# Altium footprint library ubloxLib.PcbLib: 20 footprints (part 2 of 2)
Each footprint in its own frame and in the unit in brackets; x right, y up, seen from the top. Pads: shape width x height; smd on the part's side, far side on the other; paste and mask are expansions set on the pad; w line width, h text height; cw(c..) or ccw(c..) is an arc to the next point about the centre after c.
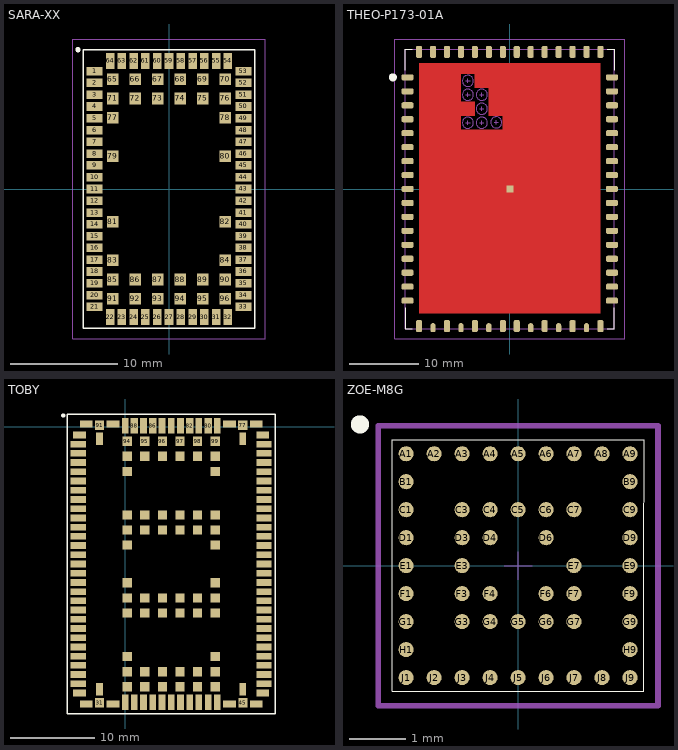
[diagram p1: the footprints below, top view; thin cyan lines are the x and y axes]

## SARA-XX [mm] "GSM/GPRS and GSM/EGPRS/HSPA Cellular Module"
height 3.25
pads (96):
  rect 1.5x0.8 smd paste-1: 1(-6.95,11) 2(-6.95,9.9) 3(-6.95,8.8) 4(-6.95,7.7) 5(-6.95,6.6) 6(-6.95,5.5) 7(-6.95,4.4) 8(-6.95,3.3) 9(-6.95,2.2) 10(-6.95,1.1) 11(-6.95,0) 12(-6.95,-1.1) 13(-6.95,-2.2) 14(-6.95,-3.3) 15(-6.95,-4.4) 16(-6.95,-5.5) 17(-6.95,-6.6) 18(-6.95,-7.7) 19(-6.95,-8.8) 20(-6.95,-9.9) 21(-6.95,-11) 33(6.95,-11) 34(6.95,-9.9) 35(6.95,-8.8) 36(6.95,-7.7) 37(6.95,-6.6) 38(6.95,-5.5) 39(6.95,-4.4) 40(6.95,-3.3) 41(6.95,-2.2) 42(6.95,-1.1) 43(6.95,0) 44(6.95,1.1) 45(6.95,2.2) 46(6.95,3.3) 47(6.95,4.4) 48(6.95,5.5) 49(6.95,6.6) 50(6.95,7.7) 51(6.95,8.8) 52(6.95,9.9) 53(6.95,11)
  rect 0.8x1.5 smd paste-1: 22(-5.5,-11.95) 23(-4.4,-11.95) 24(-3.3,-11.95) 25(-2.2,-11.95) 26(-1.1,-11.95) 27(0,-11.95) 28(1.1,-11.95) 29(2.2,-11.95) 30(3.3,-11.95) 31(4.4,-11.95) 32(5.5,-11.95) 54(5.5,11.95) 55(4.4,11.95) 56(3.3,11.95) 57(2.2,11.95) 58(1.1,11.95) 59(0,11.95) 60(-1.1,11.95) 61(-2.2,11.95) 62(-3.3,11.95) 63(-4.4,11.95) 64(-5.5,11.95)
  rect 1.1x1.1 smd paste-0.025: 65(-5.25,10.25) 66(-3.15,10.25) 67(-1.05,10.25) 68(1.05,10.25) 69(3.15,10.25) 70(5.25,10.25) 71(-5.25,8.45) 72(-3.15,8.45) 73(-1.05,8.45) 74(1.05,8.45) 75(3.15,8.45) 76(5.25,8.45) 77(-5.25,6.65) 78(5.25,6.65) 79(-5.25,3.05) 80(5.25,3.05) 81(-5.25,-3.05) 82(5.25,-3.05) 83(-5.25,-6.65) 84(5.25,-6.65) 85(-5.25,-8.45) 86(-3.15,-8.45) 87(-1.05,-8.45) 88(1.05,-8.45) 89(3.15,-8.45) 90(5.25,-8.45) 91(-5.25,-10.25) 92(-3.15,-10.25) 93(-1.05,-10.25) 94(1.05,-10.25) 95(3.15,-10.25) 96(5.25,-10.25)
Top Overlay:
  circle w0.4: c-8.5,13 r0.05
  lines w0.15: -8,-13 -8,13 8,13 8,-13 -8,-13
Top Paste:
  region: -5.125,11.225 -5.125,12.775 -5.875,12.775 -5.875,11.225
  region: -4.025,11.225 -4.025,12.775 -4.775,12.775 -4.775,11.225
  region: -2.925,11.225 -2.925,12.775 -3.675,12.775 -3.675,11.225
  region: -1.825,11.225 -1.825,12.775 -2.575,12.775 -2.575,11.225
  region: -0.725,11.225 -0.725,12.775 -1.475,12.775 -1.475,11.225
  region: 0.375,11.225 0.375,12.775 -0.375,12.775 -0.375,11.225
  region: 1.475,11.225 1.475,12.775 0.725,12.775 0.725,11.225
  region: 5.875,11.225 5.875,12.775 5.125,12.775 5.125,11.225
  region: 2.575,11.225 2.575,12.775 1.825,12.775 1.825,11.225
  region: 3.675,11.225 3.675,12.775 2.925,12.775 2.925,11.225
  region: 4.775,11.225 4.775,12.775 4.025,12.775 4.025,11.225
  rectangle: 6.225,10.625 7.775,11.375
  rectangle: 6.225,9.525 7.775,10.275
  rectangle: 6.225,8.425 7.775,9.175
  rectangle: 6.225,7.325 7.775,8.075
  rectangle: 6.225,6.225 7.775,6.975
  rectangle: 6.225,5.125 7.775,5.875
  rectangle: 6.225,4.025 7.775,4.775
  rectangle: 6.225,2.925 7.775,3.675
  rectangle: 6.225,1.825 7.775,2.575
  rectangle: 6.225,0.725 7.775,1.475
  rectangle: 6.225,-0.375 7.775,0.375
  rectangle: 6.225,-1.475 7.775,-0.725
  rectangle: 6.225,-2.575 7.775,-1.825
  rectangle: 6.225,-3.675 7.775,-2.925
  rectangle: 6.225,-4.775 7.775,-4.025
  rectangle: 6.225,-5.875 7.775,-5.125
  rectangle: 6.225,-6.975 7.775,-6.225
  rectangle: 6.225,-8.075 7.775,-7.325
  rectangle: 6.225,-9.175 7.775,-8.425
  rectangle: 6.225,-10.275 7.775,-9.525
  rectangle: 6.225,-11.375 7.775,-10.625
  region: 5.875,-12.775 5.875,-11.225 5.125,-11.225 5.125,-12.775
  region: 4.775,-12.775 4.775,-11.225 4.025,-11.225 4.025,-12.775
  region: 3.675,-12.775 3.675,-11.225 2.925,-11.225 2.925,-12.775
  region: 2.575,-12.775 2.575,-11.225 1.825,-11.225 1.825,-12.775
  region: 1.475,-12.775 1.475,-11.225 0.725,-11.225 0.725,-12.775
  region: 0.375,-12.775 0.375,-11.225 -0.375,-11.225 -0.375,-12.775
  region: -0.725,-12.775 -0.725,-11.225 -1.475,-11.225 -1.475,-12.775
  region: -1.825,-12.775 -1.825,-11.225 -2.575,-11.225 -2.575,-12.775
  region: -2.925,-12.775 -2.925,-11.225 -3.675,-11.225 -3.675,-12.775
  region: -4.025,-12.775 -4.025,-11.225 -4.775,-11.225 -4.775,-12.775
  region: -5.125,-12.775 -5.125,-11.225 -5.875,-11.225 -5.875,-12.775
  rectangle: -7.775,-11.375 -6.225,-10.625
  rectangle: -7.775,-10.275 -6.225,-9.525
  rectangle: -7.775,-9.175 -6.225,-8.425
  rectangle: -7.775,-8.075 -6.225,-7.325
  rectangle: -7.775,-6.975 -6.225,-6.225
  rectangle: -7.775,-5.875 -6.225,-5.125
  rectangle: -7.775,-4.775 -6.225,-4.025
  rectangle: -7.775,-3.675 -6.225,-2.925
  rectangle: -7.775,-2.575 -6.225,-1.825
  rectangle: -7.775,-1.475 -6.225,-0.725
  rectangle: -7.775,-0.375 -6.225,0.375
  rectangle: -7.775,0.725 -6.225,1.475
  rectangle: -7.775,1.825 -6.225,2.575
  rectangle: -7.775,2.925 -6.225,3.675
  rectangle: -7.775,4.025 -6.225,4.775
  rectangle: -7.775,5.125 -6.225,5.875
  rectangle: -7.775,6.225 -6.225,6.975
  rectangle: -7.775,7.325 -6.225,8.075
  rectangle: -7.775,8.425 -6.225,9.175
  rectangle: -7.775,9.525 -6.225,10.275
  rectangle: -7.775,10.625 -6.225,11.375
Mechanical 15:
  lines w0.05: -9,-14 -9,14 9,14 9,-14 -9,-14
3D body: height 3.25, standoff 0, extent -8,-13 8,13
3D body "SARA.STEP": height 0.13, standoff -2.87, extent -8,-13.05 8,12.95

## THEO-P173-01A [mm] "Host-based V2X transceiver module"
height 3.5
pads (69):
  rrect50% 1.7x0.87 smd: 1(-14.65,16) 2(-14.65,14) 3(-14.65,12) 4(-14.65,10) 5(-14.65,8) 6(-14.65,6) 7(-14.65,4) 8(-14.65,2) 9(-14.65,0) 10(-14.65,-2) 11(-14.65,-4) 12(-14.65,-6) 13(-14.65,-8) 14(-14.65,-10) 15(-14.65,-12) 16(-14.65,-14) 17(-14.65,-16) 32(14.65,-16) 33(14.65,-14) 34(14.65,-12) 35(14.65,-10) 36(14.65,-8) 37(14.65,-6) 38(14.65,-4) 39(14.65,-2) 40(14.65,0) 41(14.65,2) 42(14.65,4) 43(14.65,6) 44(14.65,8) 45(14.65,10) 46(14.65,12) 47(14.65,14) 48(14.65,16)
  rrect50% 0.87x1.7 smd: 18(-13,-19.65) 20(-9,-19.65) 22(-5,-19.65) 24(-1,-19.65) 25(1,-19.65) 27(5,-19.65) 29(9,-19.65) 31(13,-19.65) 49(13,19.65) 50(11,19.65) 51(9,19.65) 52(7,19.65) 53(5,19.65) 54(3,19.65) 55(1,19.65) 56(-1,19.65) 57(-3,19.65) 58(-5,19.65) 59(-7,19.65) 60(-9,19.65) 61(-11,19.65) 62(-13,19.65)
  rrect50% 0.76x1.1 smd: 19(-11,-19.95) 21(-7,-19.95) 23(-3,-19.95) 26(3,-19.95) 28(7,-19.95) 30(11,-19.95)
  round 0.76 smd: 19(-11,-19.6) 21(-7,-19.6) 23(-3,-19.6) 26(3,-19.6) 28(7,-19.6) 30(11,-19.6)
  rect 1x1 smd paste-1: GND_TAB(0,0)
Top Layer:
  region: -13,18 13,18 13,-17.8 -1,-17.8 -1,10.5 -3,10.5 -3,14.5 -5,14.5 -5,16.5 -7,16.5 -7,12.5 -5,12.5 -5,10.5 -7,10.5 -7,8.5 -1,8.5 -1,-17.8 -13,-17.8
Top Overlay:
  circle w0.635: c-16.754,16 r0.254
  lines w0.15: -15,-17 -15,-20 -14,-20 ; -15,17 -15,20 -14,20 ; 14,-20 15,-20 15,-17 ; 14,20 15,20 15,17
Top Paste:
  rectangle: -6.5,-2.3 -4.5,-0.3
  rectangle: -3.5,-2.3 -1.5,-0.3
  rectangle: -3.5,-5.3 -1.5,-3.3
  rectangle: -6.5,-5.3 -4.5,-3.3
  rectangle: -3.5,-8.3 -1.5,-6.3
  rectangle: -6.5,-8.3 -4.5,-6.3
  rectangle: -6.5,-17.3 -4.5,-15.3
  rectangle: -3.5,-17.3 -1.5,-15.3
  rectangle: -6.5,-14.3 -4.5,-12.3
  rectangle: -3.5,-14.3 -1.5,-12.3
  rectangle: -3.5,-11.3 -1.5,-9.3
  rectangle: -6.5,-11.3 -4.5,-9.3
  rectangle: -6.5,6.5 -4.5,8
  rectangle: -3.5,6.5 -1.5,8
  rectangle: -3.5,3.5 -1.5,5.5
  rectangle: -6.5,3.5 -4.5,5.5
  rectangle: -3.5,0.5 -1.5,2.5
  rectangle: -6.5,0.5 -4.5,2.5
  rectangle: -6.5,11 -5.5,11.5
  rectangle: -2.5,12.5 -1.5,14.5
  rectangle: -3.5,15.5 -1.5,17.5
  rectangle: -6.5,17 -4.5,17.5
  rectangle: -12.5,15.5 -10.5,17.5
  rectangle: -9.5,15.5 -7.5,17.5
  rectangle: -9.5,12.5 -7.5,14.5
  rectangle: -12.5,12.5 -10.5,14.5
  rectangle: -9.5,9.5 -7.5,11.5
  rectangle: -12.5,9.5 -10.5,11.5
  rectangle: -12.5,0.5 -10.5,2.5
  rectangle: -9.5,0.5 -7.5,2.5
  rectangle: -12.5,3.5 -10.5,5.5
  rectangle: -9.5,3.5 -7.5,5.5
  rectangle: -9.5,6.5 -7.5,8.5
  rectangle: -12.5,6.5 -10.5,8.5
  rectangle: -12.5,-11.3 -10.5,-9.3
  rectangle: -9.5,-11.3 -7.5,-9.3
  rectangle: -9.5,-14.3 -7.5,-12.3
  rectangle: -12.5,-14.3 -10.5,-12.3
  rectangle: -9.5,-17.3 -7.5,-15.3
  rectangle: -12.5,-17.3 -10.5,-15.3
  rectangle: -12.5,-8.3 -10.5,-6.3
  rectangle: -9.5,-8.3 -7.5,-6.3
  rectangle: -12.5,-5.3 -10.5,-3.3
  rectangle: -9.5,-5.3 -7.5,-3.3
  rectangle: -9.5,-2.3 -7.5,-0.3
  rectangle: -12.5,-2.3 -10.5,-0.3
  rectangle: -2.5,11 -1.5,11.5
  rectangle: 7.5,15.5 9.5,17.5
  rectangle: 10.5,15.5 12.5,17.5
  rectangle: 10.5,12.5 12.5,14.5
  rectangle: 7.5,12.5 9.5,14.5
  rectangle: 10.5,9.5 12.5,11.5
  rectangle: 7.5,9.5 9.5,11.5
  rectangle: 7.5,0.5 9.5,2.5
  rectangle: 10.5,0.5 12.5,2.5
  rectangle: 7.5,3.5 9.5,5.5
  rectangle: 10.5,3.5 12.5,5.5
  rectangle: 10.5,6.5 12.5,8.5
  rectangle: 7.5,6.5 9.5,8.5
  rectangle: 7.5,-11.3 9.5,-9.3
  rectangle: 10.5,-11.3 12.5,-9.3
  rectangle: 10.5,-14.3 12.5,-12.3
  rectangle: 7.5,-14.3 9.5,-12.3
  rectangle: 10.5,-17.3 12.5,-15.3
  rectangle: 7.5,-17.3 9.5,-15.3
  rectangle: 7.5,-8.3 9.5,-6.3
  rectangle: 10.5,-8.3 12.5,-6.3
  rectangle: 7.5,-5.3 9.5,-3.3
  rectangle: 10.5,-5.3 12.5,-3.3
  rectangle: 10.5,-2.3 12.5,-0.3
  rectangle: 7.5,-2.3 9.5,-0.3
  rectangle: 1.5,15.5 3.5,17.5
  rectangle: 4.5,15.5 6.5,17.5
  rectangle: 4.5,12.5 6.5,14.5
  rectangle: 1.5,12.5 3.5,14.5
  rectangle: 4.5,9.5 6.5,11.5
  rectangle: 1.5,9.5 3.5,11.5
  rectangle: 1.5,0.5 3.5,2.5
  rectangle: 4.5,0.5 6.5,2.5
  rectangle: 1.5,3.5 3.5,5.5
  rectangle: 4.5,3.5 6.5,5.5
  rectangle: 4.5,6.5 6.5,8.5
  rectangle: 1.5,6.5 3.5,8.5
  rectangle: 1.5,-11.3 3.5,-9.3
  rectangle: 4.5,-11.3 6.5,-9.3
  rectangle: 4.5,-14.3 6.5,-12.3
  rectangle: 1.5,-14.3 3.5,-12.3
  rectangle: 4.5,-17.3 6.5,-15.3
  rectangle: 1.5,-17.3 3.5,-15.3
  rectangle: 1.5,-8.3 3.5,-6.3
  rectangle: 4.5,-8.3 6.5,-6.3
  rectangle: 1.5,-5.3 3.5,-3.3
  rectangle: 4.5,-5.3 6.5,-3.3
  rectangle: 4.5,-2.3 6.5,-0.3
  rectangle: 1.5,-2.3 3.5,-0.3
  rectangle: -0.5,15.5 0.5,17.5
  rectangle: -0.5,12.5 0.5,14.5
  rectangle: -0.5,6.5 0.5,8.5
  rectangle: -0.5,9.5 0.5,11.5
  rectangle: -0.5,-2.3 0.5,-0.3
  rectangle: -0.5,-5.3 0.5,-3.3
  rectangle: -0.5,0.5 0.5,2.5
  rectangle: -0.5,3.5 0.5,5.5
  rectangle: -0.5,-14.3 0.5,-12.3
  rectangle: -0.5,-17.3 0.5,-15.3
  rectangle: -0.5,-11.3 0.5,-9.3
  rectangle: -0.5,-8.3 0.5,-6.3
Top Solder:
  region: -13.1,18.1 13.1,18.1 13.1,-17.9 -0.8,-17.9 -0.8,10.7 -2.8,10.7 -2.8,14.7 -4.8,14.7 -4.8,16.7 -7.2,16.7 -7.2,12.3 -5.2,12.3 -5.2,10.7 -7.2,10.7 -7.2,8.3 -0.8,8.3 -0.8,-17.9 -13.1,-17.9
Mechanical 13:
  circle w0.025: c-4,13.5 r0.8
  circle w0.025: c-4,9.5 r0.8
  circle w0.025: c-1.95,9.55 r0.8
  circle w0.025: c-6,9.5 r0.8
  circle w0.025: c-4,11.5 r0.8
  circle w0.025: c-6,13.5 r0.8
  circle w0.025: c-6,15.5 r0.8
  circle w0.025: c0,0 r0.762
  lines w0.025: -6.3,9.5 -5.7,9.5 ; -6.3,13.5 -5.7,13.5 ; -6.3,15.5 -5.7,15.5 ; -6,9.2 -6,9.8 ; -6,13.2 -6,13.8 ; -6,15.2 -6,15.8 ; -4.3,9.5 -3.7,9.5 ; -4.3,11.5 -3.7,11.5 ; -4.3,13.5 -3.7,13.5 ; -4,9.2 -4,9.8 ; -4,11.2 -4,11.8 ; -4,13.2 -4,13.8 ; -2.25,9.55 -1.65,9.55 ; -1.95,9.25 -1.95,9.85 ; -0.762,0 0.762,0 ; 0,-0.762 0,0.762
  lines w0.1: -15,-20 -15,20 15,20 15,-20 -15,-20
Mechanical 15:
  lines w0.05: -16.5,-21.5 -16.5,21.5 16.5,21.5 16.5,-21.5 -16.5,-21.5
3D body: height 3.6, standoff 0, extent -15,-20 15,20

## TOBY [mm] "TOBY cellular module"
pads (152):
  rect 1.5x0.8 smd paste+0 mask+0.05: 1(-5.45,-0.95) 29(-5.45,-31.75) 47(16.425,-31.75) 75(16.425,-0.95)
  rect 1.8x0.8 smd paste-0.025 mask+0.05: 2(-5.6,-2.05) 3(-5.6,-3.15) 4(-5.6,-4.25) 5(-5.6,-5.35) 6(-5.6,-6.45) 7(-5.6,-7.55) 8(-5.6,-8.65) 9(-5.6,-9.75) 10(-5.6,-10.85) 11(-5.6,-11.95) 12(-5.6,-13.05) 13(-5.6,-14.15) 14(-5.6,-15.25) 15(-5.6,-16.35) 16(-5.6,-17.45) 17(-5.6,-18.55) 18(-5.6,-19.65) 19(-5.6,-20.75) 20(-5.6,-21.85) 21(-5.6,-22.95) 22(-5.6,-24.05) 23(-5.6,-25.15) 24(-5.6,-26.25) 25(-5.6,-27.35) 26(-5.6,-28.45) 27(-5.6,-29.55) 28(-5.6,-30.65) 48(16.575,-30.65) 49(16.575,-29.55) 50(16.575,-28.45) 51(16.575,-27.35) 52(16.575,-26.25) 53(16.575,-25.15) 54(16.575,-24.05) 55(16.575,-22.95) 56(16.575,-21.85) 57(16.575,-20.75) 58(16.575,-19.65) 59(16.575,-18.55) 60(16.575,-17.45) 61(16.575,-16.35) 62(16.575,-15.25) 63(16.575,-14.15) 64(16.575,-13.05) 65(16.575,-11.95) 66(16.575,-10.85) 67(16.575,-9.75) 68(16.575,-8.65) 69(16.575,-7.55) 70(16.575,-6.45) 71(16.575,-5.35) 72(16.575,-4.25) 73(16.575,-3.15) 74(16.575,-2.05)
  rect 1.5x0.8 smd paste+0.025 mask+0.05: 30(-4.65,-33.05) 32(-1.45,-33.05) 44(12.45,-33.05) 46(15.65,-33.05) 76(15.625,0.35) 78(12.45,0.35) 90(-1.45,0.35) 92(-4.65,0.35)
  rect 1.1x1.1 smd paste+0.025 mask+0.05: 31(-3.05,-32.9) 45(14.05,-32.9) 77(14.025,0.2) 91(-3.05,0.2)
  rect 0.8x1.8 smd paste-0.025 mask+0.05: 33(0,-32.85) 34(1.1,-32.85) 35(2.2,-32.85) 36(3.3,-32.85) 37(4.4,-32.85) 38(5.5,-32.85) 39(6.6,-32.85) 40(7.7,-32.85) 41(8.8,-32.85) 42(9.9,-32.85) 43(11,-32.85) 79(11,0.15) 81(8.8,0.15) 83(6.6,0.15) 84(5.5,0.15) 85(4.4,0.15) 87(2.2,0.15) 89(0,0.15)
  rect 0.9x1.8 smd paste-0.025 mask+0.05: 80(9.9,0.15) 82(7.7,0.15) 86(3.3,0.15) 88(1.1,0.15)
  rect 0.8x1.5 smd paste+0.025 mask+0.05: 93(-3.05,-1.4) 100(14.025,-1.4) 145(-3.05,-31.3) 152(14.05,-31.3)
  rect 1.1x1.1 smd paste-0.025 mask+0.05: 94(0.25,-1.7) 95(2.35,-1.7) 96(4.45,-1.7) 97(6.55,-1.7) 98(8.65,-1.7) 99(10.75,-1.7) 101(0.25,-3.5) 102(2.35,-3.5) 103(4.45,-3.5) 104(6.55,-3.5) 105(8.65,-3.5) 106(10.75,-3.5) 107(0.25,-5.3) 108(10.75,-5.3) 109(0.25,-10.5) 110(2.35,-10.5) 111(4.45,-10.5) 112(6.55,-10.5) 113(8.65,-10.5) 114(10.75,-10.5) 115(0.25,-12.3) 116(2.35,-12.3) 117(4.45,-12.3) 118(6.55,-12.3) 119(8.65,-12.3) 120(10.75,-12.3) 121(0.25,-14.1) 122(10.75,-14.1) 123(0.25,-18.6) 124(10.75,-18.6) 125(0.25,-20.4) 126(2.35,-20.4) 127(4.45,-20.4) 128(6.55,-20.4) 129(8.65,-20.4) 130(10.75,-20.4) 131(0.25,-22.2) 132(2.35,-22.2) 133(4.45,-22.2) 134(6.55,-22.2) 135(8.65,-22.2) 136(10.75,-22.2) 137(0.25,-27.4) 138(10.75,-27.4) 139(0.25,-29.2) 140(2.35,-29.2) 141(4.45,-29.2) 142(6.55,-29.2) 143(8.65,-29.2) 144(10.75,-29.2) 146(0.25,-31) 147(2.35,-31) 148(4.45,-31) 149(6.55,-31) 150(8.65,-31) 151(10.75,-31)
Top Overlay:
  circle w0.4: c-7.384,1.353 r0.05
  lines w0.16: -6.902,-34.239 -6.902,1.549 17.882,1.549 17.901,1.53 17.901,-34.239 17.888,-34.252 -6.89,-34.252 -6.902,-34.239
3D body "TOBY.STEP": height 2.6, standoff 0, extent -6.9,-34.25 17.9,1.55

## ZOE-M8G [mm]
pads (51):
  round 0.27 smd mask+0.05: A1(-2,2) A2(-1.5,2) A3(-1,2) A4(-0.5,2) A5(0,2) A6(0.5,2) A7(1,2) A8(1.5,2) A9(2,2) B1(-2,1.5) B9(2,1.5) C1(-2,1) C3(-1,1) C4(-0.5,1) C5(0,1) C6(0.5,1) C7(1,1) C9(2,1) D1(-2,0.5) D3(-1,0.5) D4(-0.5,0.5) D6(0.5,0.5) D9(2,0.5) E1(-2,0) E3(-1,0) E7(1,0) E9(2,0) F1(-2,-0.5) F3(-1,-0.5) F4(-0.5,-0.5) F6(0.5,-0.5) F7(1,-0.5) F9(2,-0.5) G1(-2,-1) G3(-1,-1) G4(-0.5,-1) G5(0,-1) G6(0.5,-1) G7(1,-1) G9(2,-1) H1(-2,-1.5) H9(2,-1.5) J1(-2,-2) J2(-1.5,-2) J3(-1,-2) J4(-0.5,-2) J5(0,-2) J6(0.5,-2) J7(1,-2) J8(1.5,-2) J9(2,-2)
Top Overlay:
  circle w0.254: c-2.825,2.525 r0.035
  lines w0.01: -2.25,-2.248 2.249,-2.248 2.249,0.001 2.25,2.25 -2.25,2.25 -2.25,0.001 -2.25,-2.248
Mechanical 15:
  lines w0.01: -0.25,0.003 0.002,0.003 ; 0.002,-0.25 0.002,0.003 ; 0.002,0.25 0.002,0.003 ; 0.25,0.003 0.002,0.003
  lines w0.1: -2.5,-2.5 2.5,-2.5 2.5,2.5 -2.5,2.5 -2.5,-2.5
3D body: height 1, standoff 0, extent -2.25,-2.254 2.25,2.25